# Altium footprint library 3D封装库.PcbLib: 716 footprints (part 30 of 45)
Each footprint in its own frame and in the unit in brackets; x right, y up, seen from the top. Pads: shape width x height; smd on the part's side, far side on the other; paste and mask are expansions set on the pad; w line width, h text height; cw(c..) or ccw(c..) is an arc to the next point about the centre after c.
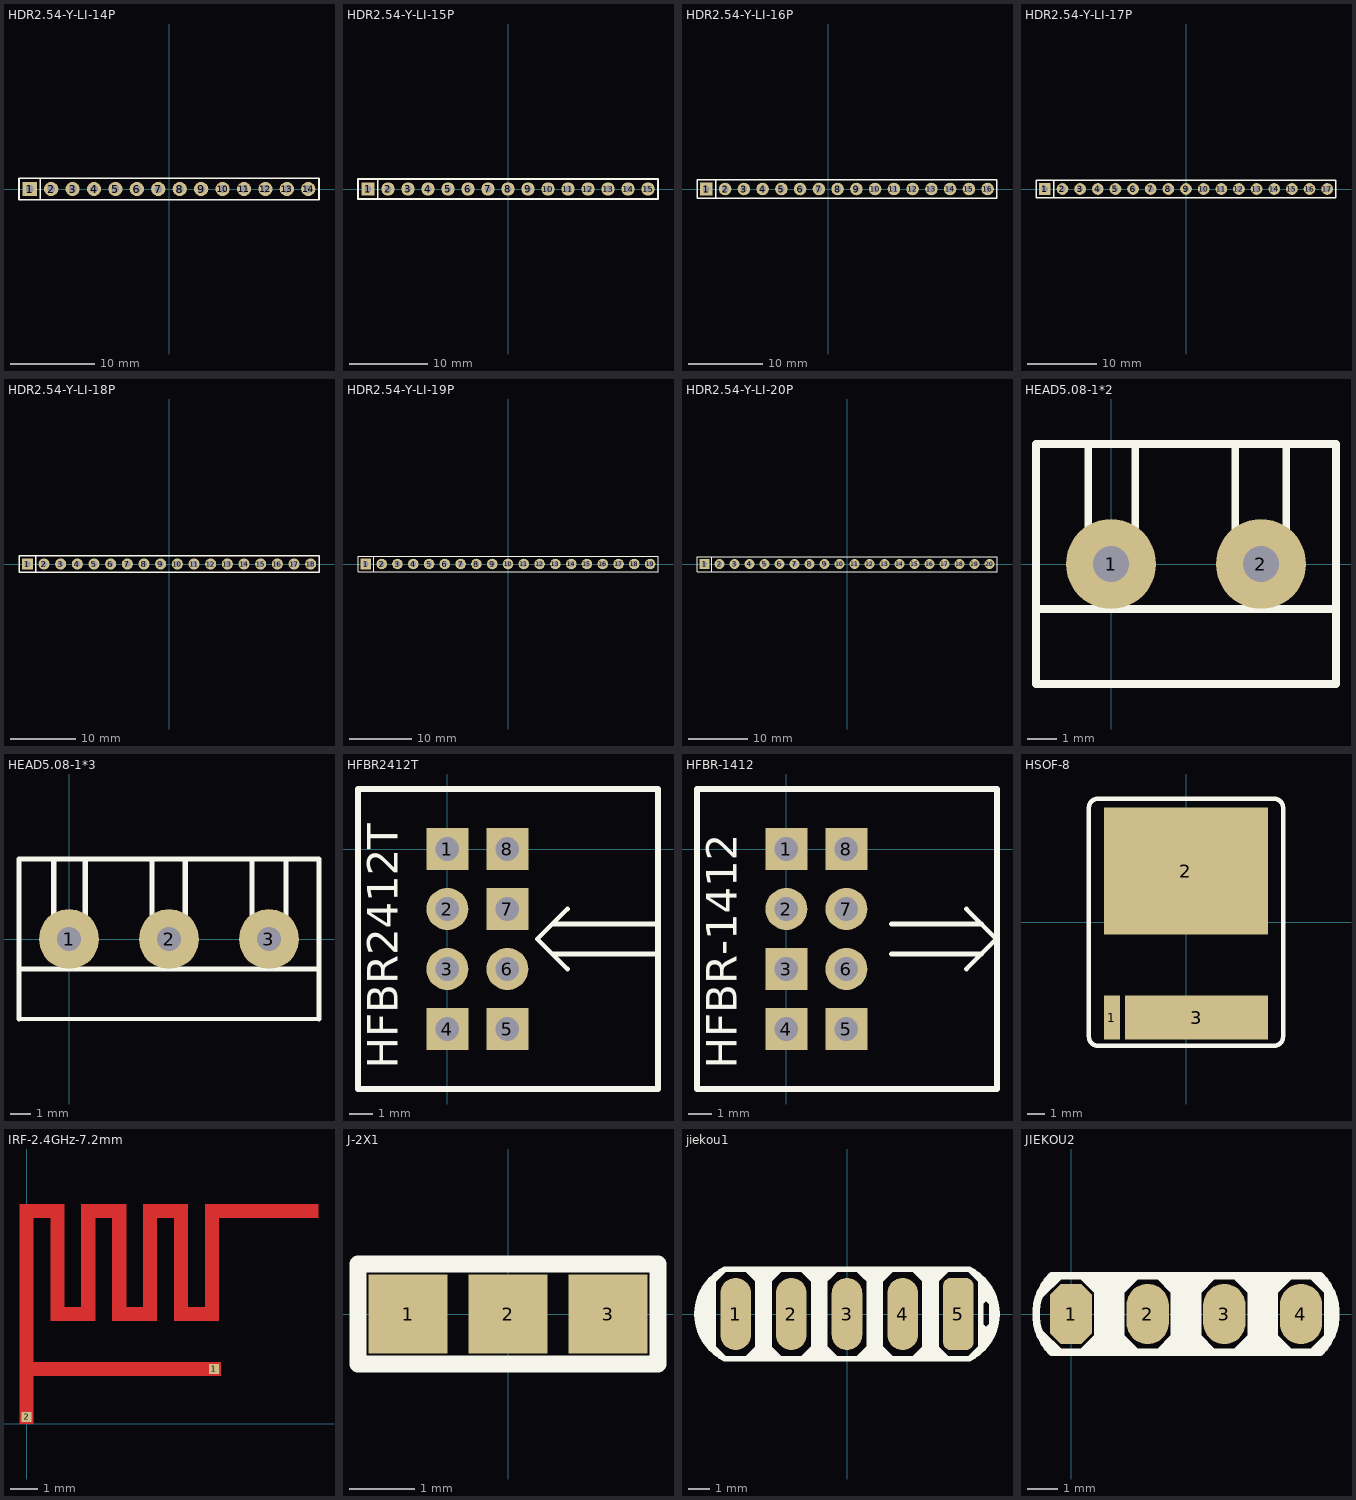
[diagram p29: the footprints below, top view; thin cyan lines are the x and y axes]

## HDR2.54-Y-LI-14P [mm] "圆孔排母，14脚"
pads (14):
  rect 1.7x1.7 hole 0.9: 1(-16.51,0)
  round 1.7 hole 0.9: 2(-13.97,0) 3(-11.43,0) 4(-8.89,0) 5(-6.35,0) 6(-3.81,0) 7(-1.27,0) 8(1.27,0) 9(3.81,0) 10(6.35,0) 11(8.89,0) 12(11.43,0) 13(13.97,0) 14(16.51,0)
Top Overlay:
  lines w0.2: -15.26,-1.25 -15.26,1.25 ; -17.78,-1.27 17.78,-1.27 17.78,1.27 -15.875,1.27 -17.78,1.27 -17.78,-1.27
3D body "HDR-1P_Y.STEP": height 4.31, standoff -3, extent -17.78,-1.27 -15.24,1.27
3D body "HDR-1P_Y.STEP": height 4.31, standoff -3, extent -15.24,-1.27 -12.7,1.27
3D body "HDR-1P_Y.STEP": height 4.31, standoff -3, extent -12.7,-1.27 -10.16,1.27
3D body "HDR-1P_Y.STEP": height 4.31, standoff -3, extent -10.16,-1.27 -7.62,1.27
3D body "HDR-1P_Y.STEP": height 4.31, standoff -3, extent -7.62,-1.27 -5.08,1.27
3D body "HDR-1P_Y.STEP": height 4.31, standoff -3, extent -5.08,-1.27 -2.54,1.27
3D body "HDR-1P_Y.STEP": height 4.31, standoff -3, extent -2.54,-1.27 0,1.27
3D body "HDR-1P_Y.STEP": height 4.31, standoff -3, extent 0,-1.27 2.54,1.27
3D body "HDR-1P_Y.STEP": height 4.31, standoff -3, extent 2.54,-1.27 5.08,1.27
3D body "HDR-1P_Y.STEP": height 4.31, standoff -3, extent 5.08,-1.27 7.62,1.27
3D body "HDR-1P_Y.STEP": height 4.31, standoff -3, extent 7.62,-1.27 10.16,1.27
3D body "HDR-1P_Y.STEP": height 4.31, standoff -3, extent 10.16,-1.27 12.7,1.27
3D body "HDR-1P_Y.STEP": height 4.31, standoff -3, extent 12.7,-1.27 15.24,1.27
3D body "HDR-1P_Y.STEP": height 4.31, standoff -3, extent 15.24,-1.27 17.78,1.27

## HDR2.54-Y-LI-15P [mm] "圆孔排母，15脚"
pads (15):
  rect 1.7x1.7 hole 0.9: 1(-17.78,0)
  round 1.7 hole 0.9: 2(-15.24,0) 3(-12.7,0) 4(-10.16,0) 5(-7.62,0) 6(-5.08,0) 7(-2.54,0) 8(0,0) 9(2.54,0) 10(5.08,0) 11(7.62,0) 12(10.16,0) 13(12.7,0) 14(15.24,0) 15(17.78,0)
Top Overlay:
  lines w0.2: -16.53,-1.25 -16.53,1.25 ; -19.05,-1.27 -19.05,1.27 -17.145,1.27 19.05,1.27 19.05,-1.27 -19.05,-1.27
3D body "HDR-1P_Y.STEP": height 4.31, standoff -3, extent -19.05,-1.27 -16.51,1.27
3D body "HDR-1P_Y.STEP": height 4.31, standoff -3, extent -16.51,-1.27 -13.97,1.27
3D body "HDR-1P_Y.STEP": height 4.31, standoff -3, extent -13.97,-1.27 -11.43,1.27
3D body "HDR-1P_Y.STEP": height 4.31, standoff -3, extent -11.43,-1.27 -8.89,1.27
3D body "HDR-1P_Y.STEP": height 4.31, standoff -3, extent -8.89,-1.27 -6.35,1.27
3D body "HDR-1P_Y.STEP": height 4.31, standoff -3, extent -6.35,-1.27 -3.81,1.27
3D body "HDR-1P_Y.STEP": height 4.31, standoff -3, extent -3.81,-1.27 -1.27,1.27
3D body "HDR-1P_Y.STEP": height 4.31, standoff -3, extent -1.27,-1.27 1.27,1.27
3D body "HDR-1P_Y.STEP": height 4.31, standoff -3, extent 1.27,-1.27 3.81,1.27
3D body "HDR-1P_Y.STEP": height 4.31, standoff -3, extent 3.81,-1.27 6.35,1.27
3D body "HDR-1P_Y.STEP": height 4.31, standoff -3, extent 6.35,-1.27 8.89,1.27
3D body "HDR-1P_Y.STEP": height 4.31, standoff -3, extent 8.89,-1.27 11.43,1.27
3D body "HDR-1P_Y.STEP": height 4.31, standoff -3, extent 11.43,-1.27 13.97,1.27
3D body "HDR-1P_Y.STEP": height 4.31, standoff -3, extent 13.97,-1.27 16.51,1.27
3D body "HDR-1P_Y.STEP": height 4.31, standoff -3, extent 16.51,-1.27 19.05,1.27

## HDR2.54-Y-LI-16P [mm] "圆孔排母，16脚"
pads (16):
  rect 1.7x1.7 hole 0.9: 1(-16.51,0)
  round 1.7 hole 0.9: 2(-13.97,0) 3(-11.43,0) 4(-8.89,0) 5(-6.35,0) 6(-3.81,0) 7(-1.27,0) 8(1.27,0) 9(3.81,0) 10(6.35,0) 11(8.89,0) 12(11.43,0) 13(13.97,0) 14(16.51,0) 15(19.05,0) 16(21.59,0)
Top Overlay:
  lines w0.2: -15.26,-1.25 -15.26,1.25 ; -17.78,-1.27 -17.78,1.27 -15.875,1.27 22.86,1.27 22.86,-1.27 -17.78,-1.27
3D body "HDR-1P_Y.STEP": height 4.31, standoff -3, extent -17.78,-1.27 -15.24,1.27
3D body "HDR-1P_Y.STEP": height 4.31, standoff -3, extent -15.24,-1.27 -12.7,1.27
3D body "HDR-1P_Y.STEP": height 4.31, standoff -3, extent -12.7,-1.27 -10.16,1.27
3D body "HDR-1P_Y.STEP": height 4.31, standoff -3, extent -10.16,-1.27 -7.62,1.27
3D body "HDR-1P_Y.STEP": height 4.31, standoff -3, extent -7.62,-1.27 -5.08,1.27
3D body "HDR-1P_Y.STEP": height 4.31, standoff -3, extent -5.08,-1.27 -2.54,1.27
3D body "HDR-1P_Y.STEP": height 4.31, standoff -3, extent -2.54,-1.27 0,1.27
3D body "HDR-1P_Y.STEP": height 4.31, standoff -3, extent 0,-1.27 2.54,1.27
3D body "HDR-1P_Y.STEP": height 4.31, standoff -3, extent 2.54,-1.27 5.08,1.27
3D body "HDR-1P_Y.STEP": height 4.31, standoff -3, extent 5.08,-1.27 7.62,1.27
3D body "HDR-1P_Y.STEP": height 4.31, standoff -3, extent 7.62,-1.27 10.16,1.27
3D body "HDR-1P_Y.STEP": height 4.31, standoff -3, extent 10.16,-1.27 12.7,1.27
3D body "HDR-1P_Y.STEP": height 4.31, standoff -3, extent 12.7,-1.27 15.24,1.27
3D body "HDR-1P_Y.STEP": height 4.31, standoff -3, extent 15.24,-1.27 17.78,1.27
3D body "HDR-1P_Y.STEP": height 4.31, standoff -3, extent 17.78,-1.27 20.32,1.27
3D body "HDR-1P_Y.STEP": height 4.31, standoff -3, extent 20.32,-1.27 22.86,1.27

## HDR2.54-Y-LI-17P [mm] "圆孔排母，17脚"
pads (17):
  rect 1.7x1.7 hole 0.9: 1(-20.32,0)
  round 1.7 hole 0.9: 2(-17.78,0) 3(-15.24,0) 4(-12.7,0) 5(-10.16,0) 6(-7.62,0) 7(-5.08,0) 8(-2.54,0) 9(0,0) 10(2.54,0) 11(5.08,0) 12(7.62,0) 13(10.16,0) 14(12.7,0) 15(15.24,0) 16(17.78,0) 17(20.32,0)
Top Overlay:
  lines w0.2: -21.59,-1.27 -21.59,1.27 -19.685,1.27 21.59,1.27 21.59,-1.27 -19.07,-1.27 -19.07,1.25
  lines w0.203: -21.59,-1.27 -18.796,-1.27
3D body "HDR-1P_Y.STEP": height 4.31, standoff -3, extent -21.59,-1.27 -19.05,1.27
3D body "HDR-1P_Y.STEP": height 4.31, standoff -3, extent -19.05,-1.27 -16.51,1.27
3D body "HDR-1P_Y.STEP": height 4.31, standoff -3, extent -16.51,-1.27 -13.97,1.27
3D body "HDR-1P_Y.STEP": height 4.31, standoff -3, extent -13.97,-1.27 -11.43,1.27
3D body "HDR-1P_Y.STEP": height 4.31, standoff -3, extent -11.43,-1.27 -8.89,1.27
3D body "HDR-1P_Y.STEP": height 4.31, standoff -3, extent -8.89,-1.27 -6.35,1.27
3D body "HDR-1P_Y.STEP": height 4.31, standoff -3, extent -6.35,-1.27 -3.81,1.27
3D body "HDR-1P_Y.STEP": height 4.31, standoff -3, extent -3.81,-1.27 -1.27,1.27
3D body "HDR-1P_Y.STEP": height 4.31, standoff -3, extent -1.27,-1.27 1.27,1.27
3D body "HDR-1P_Y.STEP": height 4.31, standoff -3, extent 1.27,-1.27 3.81,1.27
3D body "HDR-1P_Y.STEP": height 4.31, standoff -3, extent 3.81,-1.27 6.35,1.27
3D body "HDR-1P_Y.STEP": height 4.31, standoff -3, extent 6.35,-1.27 8.89,1.27
3D body "HDR-1P_Y.STEP": height 4.31, standoff -3, extent 8.89,-1.27 11.43,1.27
3D body "HDR-1P_Y.STEP": height 4.31, standoff -3, extent 11.43,-1.27 13.97,1.27
3D body "HDR-1P_Y.STEP": height 4.31, standoff -3, extent 13.97,-1.27 16.51,1.27
3D body "HDR-1P_Y.STEP": height 4.31, standoff -3, extent 16.51,-1.27 19.05,1.27
3D body "HDR-1P_Y.STEP": height 4.31, standoff -3, extent 19.05,-1.27 21.59,1.27

## HDR2.54-Y-LI-18P [mm] "圆孔排母，18脚"
pads (18):
  rect 1.7x1.7 hole 0.9: 1(-21.59,0)
  round 1.7 hole 0.9: 2(-19.05,0) 3(-16.51,0) 4(-13.97,0) 5(-11.43,0) 6(-8.89,0) 7(-6.35,0) 8(-3.81,0) 9(-1.27,0) 10(1.27,0) 11(3.81,0) 12(6.35,0) 13(8.89,0) 14(11.43,0) 15(13.97,0) 16(16.51,0) 17(19.05,0) 18(21.59,0)
Top Overlay:
  lines w0.2: -21.082,1.27 22.86,1.27 22.86,-1.27 -22.86,-1.27 -22.86,1.27 -20.955,1.27 ; -20.34,-1.25 -20.34,1.25
3D body "HDR-1P_Y.STEP": height 4.31, standoff -3, extent -22.86,-1.27 -20.32,1.27
3D body "HDR-1P_Y.STEP": height 4.31, standoff -3, extent -20.32,-1.27 -17.78,1.27
3D body "HDR-1P_Y.STEP": height 4.31, standoff -3, extent -17.78,-1.27 -15.24,1.27
3D body "HDR-1P_Y.STEP": height 4.31, standoff -3, extent -15.24,-1.27 -12.7,1.27
3D body "HDR-1P_Y.STEP": height 4.31, standoff -3, extent -12.7,-1.27 -10.16,1.27
3D body "HDR-1P_Y.STEP": height 4.31, standoff -3, extent -10.16,-1.27 -7.62,1.27
3D body "HDR-1P_Y.STEP": height 4.31, standoff -3, extent -7.62,-1.27 -5.08,1.27
3D body "HDR-1P_Y.STEP": height 4.31, standoff -3, extent -5.08,-1.27 -2.54,1.27
3D body "HDR-1P_Y.STEP": height 4.31, standoff -3, extent -2.54,-1.27 0,1.27
3D body "HDR-1P_Y.STEP": height 4.31, standoff -3, extent 0,-1.27 2.54,1.27
3D body "HDR-1P_Y.STEP": height 4.31, standoff -3, extent 2.54,-1.27 5.08,1.27
3D body "HDR-1P_Y.STEP": height 4.31, standoff -3, extent 5.08,-1.27 7.62,1.27
3D body "HDR-1P_Y.STEP": height 4.31, standoff -3, extent 7.62,-1.27 10.16,1.27
3D body "HDR-1P_Y.STEP": height 4.31, standoff -3, extent 10.16,-1.27 12.7,1.27
3D body "HDR-1P_Y.STEP": height 4.31, standoff -3, extent 12.7,-1.27 15.24,1.27
3D body "HDR-1P_Y.STEP": height 4.31, standoff -3, extent 15.24,-1.27 17.78,1.27
3D body "HDR-1P_Y.STEP": height 4.31, standoff -3, extent 17.78,-1.27 20.32,1.27
3D body "HDR-1P_Y.STEP": height 4.31, standoff -3, extent 20.32,-1.27 22.86,1.27

## HDR2.54-Y-LI-19P [mm] "圆孔排母，19脚"
pads (19):
  rect 1.7x1.7 hole 0.9: 1(-22.86,0)
  round 1.7 hole 0.9: 2(-20.32,0) 3(-17.78,0) 4(-15.24,0) 5(-12.7,0) 6(-10.16,0) 7(-7.62,0) 8(-5.08,0) 9(-2.54,0) 10(0,0) 11(2.54,0) 12(5.08,0) 13(7.62,0) 14(10.16,0) 15(12.7,0) 16(15.24,0) 17(17.78,0) 18(20.32,0) 19(22.86,0)
Top Overlay:
  lines w0.2: -21.61,-1.25 -21.61,1.25 ; -24.13,-1.27 -24.13,1.27 -22.225,1.27 24.13,1.27 24.13,-1.27 -24.13,-1.27
3D body "HDR-1P_Y.STEP": height 4.31, standoff -3, extent -24.13,-1.27 -21.59,1.27
3D body "HDR-1P_Y.STEP": height 4.31, standoff -3, extent -21.59,-1.27 -19.05,1.27
3D body "HDR-1P_Y.STEP": height 4.31, standoff -3, extent -19.05,-1.27 -16.51,1.27
3D body "HDR-1P_Y.STEP": height 4.31, standoff -3, extent -16.51,-1.27 -13.97,1.27
3D body "HDR-1P_Y.STEP": height 4.31, standoff -3, extent -13.97,-1.27 -11.43,1.27
3D body "HDR-1P_Y.STEP": height 4.31, standoff -3, extent -11.43,-1.27 -8.89,1.27
3D body "HDR-1P_Y.STEP": height 4.31, standoff -3, extent -8.89,-1.27 -6.35,1.27
3D body "HDR-1P_Y.STEP": height 4.31, standoff -3, extent -6.35,-1.27 -3.81,1.27
3D body "HDR-1P_Y.STEP": height 4.31, standoff -3, extent -3.81,-1.27 -1.27,1.27
3D body "HDR-1P_Y.STEP": height 4.31, standoff -3, extent -1.27,-1.27 1.27,1.27
3D body "HDR-1P_Y.STEP": height 4.31, standoff -3, extent 1.27,-1.27 3.81,1.27
3D body "HDR-1P_Y.STEP": height 4.31, standoff -3, extent 3.81,-1.27 6.35,1.27
3D body "HDR-1P_Y.STEP": height 4.31, standoff -3, extent 6.35,-1.27 8.89,1.27
3D body "HDR-1P_Y.STEP": height 4.31, standoff -3, extent 8.89,-1.27 11.43,1.27
3D body "HDR-1P_Y.STEP": height 4.31, standoff -3, extent 11.43,-1.27 13.97,1.27
3D body "HDR-1P_Y.STEP": height 4.31, standoff -3, extent 13.97,-1.27 16.51,1.27
3D body "HDR-1P_Y.STEP": height 4.31, standoff -3, extent 16.51,-1.27 19.05,1.27
3D body "HDR-1P_Y.STEP": height 4.31, standoff -3, extent 19.05,-1.27 21.59,1.27
3D body "HDR-1P_Y.STEP": height 4.31, standoff -3, extent 21.59,-1.27 24.13,1.27

## HDR2.54-Y-LI-20P [mm] "圆孔排母，20脚"
pads (20):
  rect 1.7x1.7 hole 0.9: 1(-24.13,0)
  round 1.7 hole 0.9: 2(-21.59,0) 3(-19.05,0) 4(-16.51,0) 5(-13.97,0) 6(-11.43,0) 7(-8.89,0) 8(-6.35,0) 9(-3.81,0) 10(-1.27,0) 11(1.27,0) 12(3.81,0) 13(6.35,0) 14(8.89,0) 15(11.43,0) 16(13.97,0)
  round 1.7 hole 0.762: 17(16.51,0) 18(19.05,0) 19(21.59,0) 20(24.13,0)
Top Overlay:
  lines w0.2: -22.88,-1.25 -22.88,1.25 ; -25.4,-1.27 -25.4,1.27 -23.495,1.27 25.4,1.27 25.4,-1.27 -25.4,-1.27
3D body "HDR-1P_Y.STEP": height 4.31, standoff -3, extent 22.86,-1.27 25.4,1.27
3D body "HDR-1P_Y.STEP": height 4.31, standoff -3, extent 20.32,-1.27 22.86,1.27
3D body "HDR-1P_Y.STEP": height 4.31, standoff -3, extent 17.78,-1.27 20.32,1.27
3D body "HDR-1P_Y.STEP": height 4.31, standoff -3, extent 15.24,-1.27 17.78,1.27
3D body "HDR-1P_Y.STEP": height 4.31, standoff -3, extent 12.7,-1.27 15.24,1.27
3D body "HDR-1P_Y.STEP": height 4.31, standoff -3, extent 10.16,-1.27 12.7,1.27
3D body "HDR-1P_Y.STEP": height 4.31, standoff -3, extent 7.62,-1.27 10.16,1.27
3D body "HDR-1P_Y.STEP": height 4.31, standoff -3, extent 5.08,-1.27 7.62,1.27
3D body "HDR-1P_Y.STEP": height 4.31, standoff -3, extent 2.54,-1.27 5.08,1.27
3D body "HDR-1P_Y.STEP": height 4.31, standoff -3, extent 0,-1.27 2.54,1.27
3D body "HDR-1P_Y.STEP": height 4.31, standoff -3, extent -2.54,-1.27 0,1.27
3D body "HDR-1P_Y.STEP": height 4.31, standoff -3, extent -5.08,-1.27 -2.54,1.27
3D body "HDR-1P_Y.STEP": height 4.31, standoff -3, extent -7.62,-1.27 -5.08,1.27
3D body "HDR-1P_Y.STEP": height 4.31, standoff -3, extent -10.16,-1.27 -7.62,1.27
3D body "HDR-1P_Y.STEP": height 4.31, standoff -3, extent -12.7,-1.27 -10.16,1.27
3D body "HDR-1P_Y.STEP": height 4.31, standoff -3, extent -15.24,-1.27 -12.7,1.27
3D body "HDR-1P_Y.STEP": height 4.31, standoff -3, extent -17.78,-1.27 -15.24,1.27
3D body "HDR-1P_Y.STEP": height 4.31, standoff -3, extent -20.32,-1.27 -17.78,1.27
3D body "HDR-1P_Y.STEP": height 4.31, standoff -3, extent -22.86,-1.27 -20.32,1.27
3D body "HDR-1P_Y.STEP": height 4.31, standoff -3, extent -25.4,-1.27 -22.86,1.27

## HEAD5.08-1*2 [mm]
pads (2):
  round 3 hole 1.2: 1(0,0) 2(5,0)
Top Overlay:
  lines w0.254: -2.5,-1.5 7.5,-1.5 ; -0.762,0.025 -0.762,3.975 ; 0.813,0.051 0.813,4 ; 4.14,-0.025 4.14,3.924 ; 5.842,-0.025 5.842,3.924 ; -2.5,-4 -2.5,4 2.9,4 7.5,4 7.5,-4 -2.5,-4

## HEAD5.08-1*3 [mm]
pads (3):
  round 3 hole 1.2: 1(0,0) 2(5,0) 3(10,0)
Top Overlay:
  lines w0.2: -2.5,-4 12.5,-4
  lines w0.254: -2.5,-4 -2.5,4 2.9,4 ; -2.5,-1.5 12.446,-1.5 ; -0.762,0.025 -0.762,3.975 ; 0.813,0.051 0.813,4 ; 2.5,4 7.9,4 12.5,4 12.5,-4 ; 4.14,-0.025 4.14,3.924 ; 5.813,0.051 5.813,4 ; 9.14,-0.025 9.14,3.924 ; 10.842,-0.025 10.842,3.924

## HFBR2412T [mil]
pads (8):
  rect 70x70 hole 39.37: 1(0,0) 4(0,-300) 5(100,-300) 7(100,-100) 8(100,0)
  round 70 hole 39.37: 2(0,-100) 3(0,-200) 6(100,-200)
Top Overlay:
  lines w7.87: 200,-200 175,-175 ; 200,-100 175,-125 ; 350,-175 175,-175 ; 351,-125 175,-125 ; 175,-175 150,-150 175,-125
  lines w10: -149,-400 351,-400 351,100 -149,100 -149,-400
  text "HFBR2412T" at -82.68,-366.14 h51.18

## HFBR-1412 [mil]
pads (8):
  rect 70x70 hole 39.37: 1(0,0) 3(0,-200) 4(0,-300) 5(100,-300) 8(100,0)
  round 70 hole 39.37: 2(0,-100) 6(100,-200) 7(100,-100)
Top Overlay:
  lines w7.87: 175,-175 325,-175 ; 175,-125 325,-125 ; 300,-200 350,-150 ; 300,-100 350,-150 ; 350,-150 351,-150 350,-150
  lines w10: -149,-400 -149,100 351,100 351,-400 -149,-400
  text "HFBR-1412" at -82.68,-366.14 h51.18

## HSOF-8 [mm]
pads (3):
  rect 0.9x2.5 smd: 1(-4.2,-5.4)
  rect 9.3x7.2 smd: 2(0,2.9)
  rect 8.1x2.5 smd: 3(0.6,-5.4)
Top Overlay:
  lines w0.254: -5.5,-6.5 ccw(c-5,-6.5) -5,-7 5,-7 ccw(c5,-6.5) 5.5,-6.5 5.5,6.5 ccw(c5,6.5) 5,7 -5,7 ccw(c-5,6.5) -5.5,6.5 -5.5,-6.5
3D body: height 3, standoff 0, extent -5,-6.45 5,6.2

## IRF-2.4GHz-7.2mm [mil]
pads (2):
  rect 15x15 smd mask+3.5: 1(273,80) 2(0,10)
Top Layer:
  region: 425,320 260,320 260,170 235,170 235,320 170,320 170,170 145,170 145,320 80,320 80,170 55,170 55,320 -10,320 -10,40 -10,0 10,0 10,40 10,70 283,70 283,90 10,90 10,300 35,300 35,150 100,150 100,300 125,300 125,150 190,150 190,300 215,300 215,150 280,150 280,300 425,300
Top Solder:
  region: 11,-1 11,69 284,69 284,91 11,91 11,299 34,299 34,149 101,149 101,299 124,299 124,149 191,149 191,299 214,299 214,149 281,149 281,299 426,299 426,321 259,321 259,171 236,171 236,321 169,321 169,171 146,171 146,321 79,321 79,171 56,171 56,321 -11,321 -11,-1

## J-2X1 [mm]
pads (3):
  rect 1.2x1.2 smd: 1(-1.524,0) 2(0,0) 3(1.524,0)
Top Overlay:
  lines w0.254: -2.286,-0.762 -2.286,0.762 2.286,0.762 2.286,-0.762 -2.286,-0.762

## jiekou1 [mm]
pads (5):
  oval 1.4x3.3 smd: 1(-5.08,0) 2(-2.54,0) 3(0,0) 4(2.54,0)
  rrect50% 1.4x3.3 smd: 5(5.08,0)
Top Overlay:
  lines w0.254: -6.35,-1.27 -6.35,1.27 ; -4.572,-2.032 -4.064,-1.524 -3.556,-1.524 -3.048,-2.032 -3.302,-2.032 -3.556,-1.778 -4.064,-1.778 -4.318,-2.032 ; -4.572,2.032 -3.81,1.27 -3.048,2.032 ; -4.318,2.032 -4.064,1.778 -3.556,1.778 -3.302,2.032 ; -4.064,-2.032 -4.064,2.032 ; -3.81,-2.032 -3.81,2.032 ; -3.556,-2.032 -3.556,2.032 ; -2.032,-2.032 -1.524,-1.524 -1.016,-1.524 -0.508,-2.032 -0.762,-2.032 -1.016,-1.778 -1.524,-1.778 -1.778,-2.032 ; -2.032,2.032 -1.27,1.27 -0.508,2.032 ; -1.778,2.032 -1.524,1.778 -1.016,1.778 -0.762,2.032 ; -1.524,-2.032 -1.524,2.032 ; -1.27,-2.032 -1.27,2.032 ; -1.016,-2.032 -1.016,2.032 ; 0.508,-2.032 1.016,-1.524 1.524,-1.524 2.032,-2.032 1.778,-2.032 1.524,-1.778 1.016,-1.778 0.762,-2.032 ; 0.508,2.032 1.27,1.27 2.032,2.032 ; 0.762,2.032 1.016,1.778 1.524,1.778 1.778,2.032 ; 1.016,-2.032 1.016,2.032 ; 1.27,-2.032 1.27,2.032 ; 1.524,-2.032 1.524,2.032 ; 3.048,-2.032 3.556,-1.524 4.064,-1.524 4.572,-2.032 4.318,-2.032 4.064,-1.778 3.556,-1.778 3.302,-2.032 ; 3.048,2.032 3.81,1.27 4.572,2.032 ; 3.302,2.032 3.556,1.778 4.064,1.778 4.318,2.032 ; 3.556,-2.032 3.556,2.032 ; 3.81,-2.032 3.81,2.032 ; 4.064,-2.032 4.064,2.032 ; 6.096,-0.508 6.35,-0.762 6.604,-0.508 6.604,-0.762 ; 6.096,0.508 6.35,0.762 6.604,0.508 ; 6.096,1.27 6.35,1.27 6.604,1.016 ; 6.604,0.762 6.096,0.762 6.096,1.016 6.604,1.016 ; -6.096,-1.524 -5.588,-2.032 ; -6.096,-1.524 -6.604,-1.016 -6.604,0.762 -6.604,1.016 -6.096,1.524 ; -6.096,-1.524 -6.096,1.524 ; -6.096,1.524 -5.588,2.032 ; -5.588,-2.032 cw(c-4.572,0) -5.588,2.032 ; -5.588,-2.032 5.588,-2.032 ; -5.588,2.032 5.588,2.032 ; 5.588,-2.032 ccw(c4.572,0) 5.588,2.032 ; 5.588,-2.032 6.096,-1.524 ; 5.588,2.032 6.096,1.524 ; 6.096,-1.524 6.096,1.524 ; 6.096,-1.524 6.604,-1.016 ; 6.096,-1.016 6.096,-0.762 6.604,-0.762 ; 6.096,-1.016 6.604,-1.016 ; 6.096,-1.016 6.35,-1.27 6.604,-1.016 ; 6.096,1.524 6.604,1.016 ; 6.604,-1.016 6.604,-0.762 ; 6.604,-0.762 6.604,1.016

## JIEKOU2 [mm]
pads (4):
  oct 1.4x2 smd: 1(0,0)
  oval 1.4x2 smd: 2(2.54,0) 3(5.08,0) 4(7.62,0)
Top Overlay:
  lines w0.254: -1.016,-0.635 -0.381,-1.27 ; -1.016,0.635 -0.381,1.27 ; 0.381,-1.27 0.889,-0.762 ; 0.381,1.27 0.889,0.762 ; 0.635,-1.016 1.905,-1.016 ; 0.635,1.016 1.905,1.016 ; 1.143,-0.762 1.143,0.762 ; 1.397,-0.762 1.397,0.762 ; 2.159,-1.27 1.651,-0.762 ; 2.159,1.27 1.651,0.762 ; 2.921,-1.27 3.429,-0.762 ; 2.921,1.27 3.429,0.762 ; 3.175,-1.016 4.445,-1.016 ; 3.175,1.016 4.445,1.016 ; 3.683,-0.762 3.683,0.762 ; 3.937,-0.762 3.937,0.762 ; 4.699,-1.27 4.191,-0.762 ; 4.699,1.27 4.191,0.762 ; 5.461,-1.27 5.969,-0.762 ; 5.461,1.27 5.969,0.762 ; 5.715,-1.016 6.985,-1.016 ; 5.715,1.016 6.985,1.016 ; 6.223,-0.762 6.223,0.762 ; 6.477,-0.762 6.477,0.762 ; 7.239,-1.27 6.731,-0.762 ; 7.239,1.27 6.731,0.762 ; 8.001,-1.27 8.509,-0.762 8.509,-0.635 8.509,0.762 8.001,1.27 ; 8.636,-0.381 8.636,0.508 ; 0.889,-0.762 0.889,-0.635 ; 0.889,-0.762 1.651,-0.762 ; 0.889,-0.762 0.889,-0.635 ; 0.889,-0.635 0.889,0.762 ; 0.889,0.762 1.651,0.762 ; 1.651,-0.762 1.651,-0.635 ; 1.651,-0.762 1.651,-0.635 ; 1.651,-0.635 1.651,0.762 ; 3.429,-0.762 3.429,-0.635 ; 3.429,-0.762 4.191,-0.762 ; 3.429,-0.762 3.429,-0.635 ; 3.429,-0.635 3.429,0.762 ; 3.429,0.762 4.191,0.762 ; 4.191,-0.762 4.191,-0.635 ; 4.191,-0.762 4.191,-0.635 ; 4.191,-0.635 4.191,0.762 ; 5.969,-0.762 6.731,-0.762 ; 5.969,-0.762 5.969,-0.635 5.969,0.762 ; 5.969,0.762 6.731,0.762 ; 6.731,-0.762 6.731,-0.635 6.731,0.762 ; -0.635,-1.27 cw(c0.635,0) -0.635,1.27 8.255,1.27 cw(c6.985,0) 8.255,-1.27 -0.635,-1.27